# Altium footprint library Metric_Thru_Hole.PcbLib: 91 footprints (part 4 of 6)
Each footprint in its own frame and in the unit in brackets; x right, y up, seen from the top. Pads: shape width x height; smd on the part's side, far side on the other; paste and mask are expansions set on the pad; w line width, h text height; cw(c..) or ccw(c..) is an arc to the next point about the centre after c.
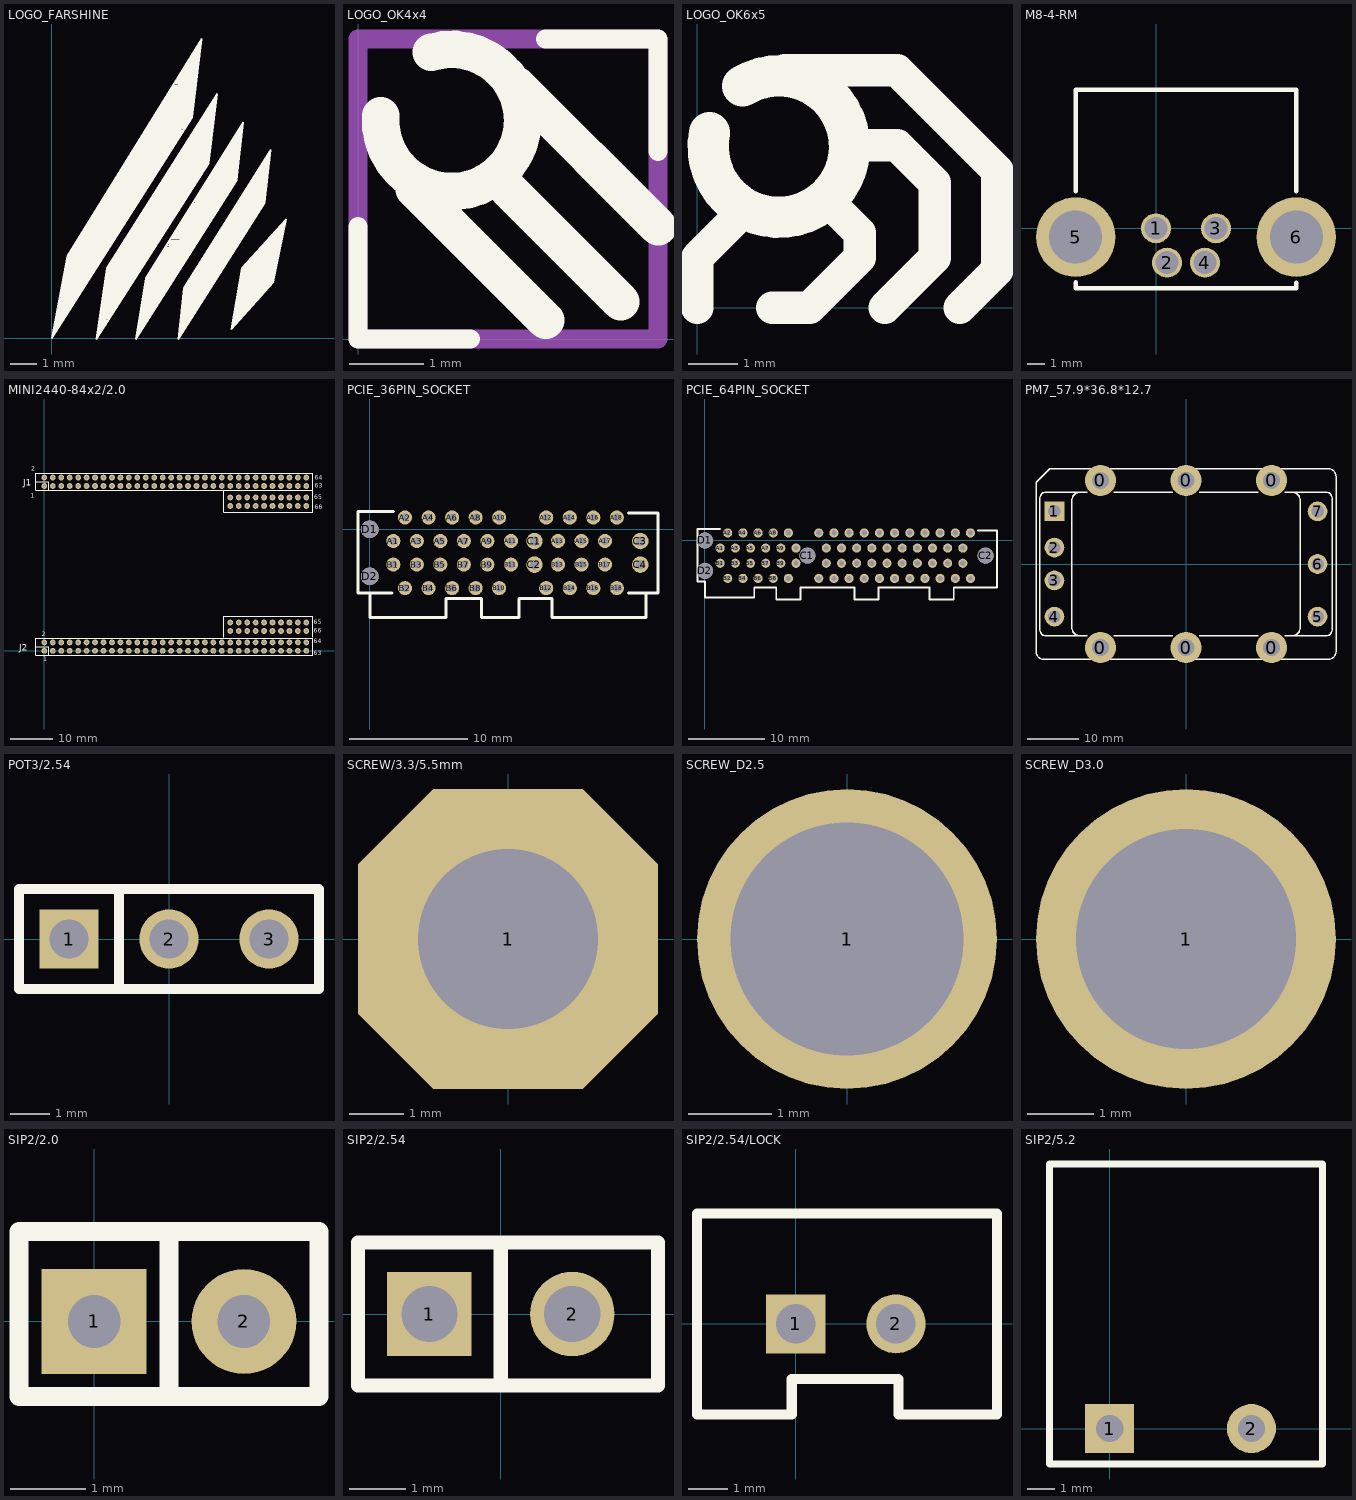
[diagram p3: the footprints below, top view; thin cyan lines are the x and y axes]

## LOGO_FARSHINE [mm] "远光公司标志"
Top Overlay:
  drawing of 1457 lines, arcs and shapes, not listed

## LOGO_OK4x4 [mm] "Okay公司标志 4mm x 4mm"
Top Overlay:
  lines w0.254: 0,1.524 0,0 1.524,0 ; 2.54,4.064 4.064,4.064 4.064,2.54
  lines w0.508: 0.308,3.027 ccw(c1.268,2.96) 0.994,3.883 ; 0.762,2.032 2.54,0.254 ; 2.032,2.032 3.556,0.508 ; 2.159,3.429 4.064,1.524
Mechanical 13:
  lines w0.254: 0,0 0,4.064 4.064,4.064 4.064,0 0,0

## LOGO_OK6x5 [mm] "Okay公司标志 6mm x 5mm"
Top Overlay:
  lines w0.254: 2.286,2.032 2.794,2.032
  lines w0.66: 0,0 0,1.016 1.016,2.032 ; 1.524,0 2.286,0 3.302,1.016 3.302,1.524 2.794,2.032 ; 1.778,4.826 4.064,4.826 6.096,2.794 6.096,0.762 5.334,0 ; 3.048,3.302 4.064,3.302 4.826,2.54 4.826,1.016 3.81,0
  lines w0.838: 0.254,3.556 ccw(c1.663,3.274) 0.924,4.506

## M8-4-RM [mm] "M8针式插头连接器，4芯，公头，弯脚"
pads (6):
  round 1.7 hole 1.3: 1(0,0) 2(0.625,-1.95) 3(3.4,0) 4(2.775,-1.95)
  round 4.5 hole 3: 5(-4.55,-0.5) 6(7.95,-0.5)
Top Overlay:
  lines w0.254: -4.55,-3.05 -4.55,-3.4 7.95,-3.4 7.95,-3.1 ; -4.55,2.1 -4.55,7.85 7.95,7.85 7.95,2.1
3D body "M8-1456048.stp": height 13.4, standoff -2.65, extent -4.647,-2.515 8.153,19.635

## MINI2440-84x2/2.0 [mil] "mini2440座pitch=2.0mm"
height 157.48
pads (168):
  round 54 hole 28: J1-1(0,1535.43) J1-2(0,1614.17) J1-3(78.74,1535.43) J1-4(78.74,1614.17) J1-5(157.48,1535.43) J1-6(157.48,1614.17) J1-7(236.22,1535.43) J1-8(236.22,1614.17) J1-9(314.96,1535.43) J1-10(314.96,1614.17) J1-11(393.7,1535.43) J1-12(393.7,1614.17) J1-13(472.44,1535.43) J1-14(472.44,1614.17) J1-15(551.18,1535.43) J1-16(551.18,1614.17) J1-17(629.92,1535.43) J1-18(629.92,1614.17) J1-19(708.66,1535.43) J1-20(708.66,1614.17) J1-21(787.4,1535.43) J1-22(787.4,1614.17) J1-23(866.14,1535.43) J1-24(866.14,1614.17) J1-25(944.88,1535.43) J1-26(944.88,1614.17) J1-27(1023.62,1535.43) J1-28(1023.62,1614.17) J1-29(1102.36,1535.43) J1-30(1102.36,1614.17) J1-31(1181.1,1535.43) J1-32(1181.1,1614.17) J1-33(1259.84,1535.43) J1-34(1259.84,1614.17) J1-35(1338.58,1535.43) J1-36(1338.58,1614.17) J1-37(1417.32,1535.43) J1-38(1417.32,1614.17) J1-39(1496.06,1535.43) J1-40(1496.06,1614.17) J1-41(1574.8,1535.43) J1-42(1574.8,1614.17) J1-43(1653.54,1535.43) J1-44(1653.54,1614.17) J1-45(1732.28,1535.43) J1-46(1732.28,1614.17) J1-47(1811.02,1535.43) J1-48(1811.02,1614.17) J1-49(1889.76,1535.43) J1-50(1889.76,1614.17) J1-51(1968.5,1535.43) J1-52(1968.5,1614.17) J1-53(2047.24,1535.43) J1-54(2047.24,1614.17) J1-55(2125.98,1535.43) J1-56(2125.98,1614.17) J1-57(2204.72,1535.43) J1-58(2204.72,1614.17) J1-59(2283.46,1535.43) J1-60(2283.46,1614.17) J1-61(2362.2,1535.43) J1-62(2362.2,1614.17) J1-63(2440.94,1535.43) J1-64(2440.94,1614.17) J1-65(2440.94,1429.13) J1-66(2440.94,1350.39) J1-67(2362.2,1429.13) J1-68(2362.2,1350.39) J1-69(2283.46,1429.13) J1-70(2283.46,1350.39) J1-71(2204.72,1429.13) J1-72(2204.72,1350.39) J1-73(2125.98,1429.13) J1-74(2125.98,1350.39) J1-75(2047.24,1429.13) J1-76(2047.24,1350.39) J1-77(1968.5,1429.13) J1-78(1968.5,1350.39) J1-79(1889.76,1429.13) J1-80(1889.76,1350.39) J1-81(1811.02,1429.13) J1-82(1811.02,1350.39) J1-83(1732.28,1429.13) J1-84(1732.28,1350.39) J2-1(0,0) J2-2(0,78.74) J2-3(78.74,0) J2-4(78.74,78.74) J2-5(157.48,0) J2-6(157.48,78.74) J2-7(236.22,0) J2-8(236.22,78.74) J2-9(314.96,0) J2-10(314.96,78.74) J2-11(393.7,0) J2-12(393.7,78.74) J2-13(472.44,0) J2-14(472.44,78.74) J2-15(551.18,0) J2-16(551.18,78.74) J2-17(629.92,0) J2-18(629.92,78.74) J2-19(708.66,0) J2-20(708.66,78.74) J2-21(787.4,0) J2-22(787.4,78.74) J2-23(866.14,0) J2-24(866.14,78.74) J2-25(944.88,0) J2-26(944.88,78.74) J2-27(1023.62,0) J2-28(1023.62,78.74) J2-29(1102.36,0) J2-30(1102.36,78.74) J2-31(1181.1,0) J2-32(1181.1,78.74) J2-33(1259.84,0) J2-34(1259.84,78.74) J2-35(1338.58,0) J2-36(1338.58,78.74) J2-37(1417.32,0) J2-38(1417.32,78.74) J2-39(1496.06,0) J2-40(1496.06,78.74) J2-41(1574.8,0) J2-42(1574.8,78.74) J2-43(1653.54,0) J2-44(1653.54,78.74) J2-45(1732.28,0) J2-46(1732.28,78.74) J2-47(1811.02,0) J2-48(1811.02,78.74) J2-49(1889.76,0) J2-50(1889.76,78.74) J2-51(1968.5,0) J2-52(1968.5,78.74) J2-53(2047.24,0) J2-54(2047.24,78.74) J2-55(2125.98,0) J2-56(2125.98,78.74) J2-57(2204.72,0) J2-58(2204.72,78.74) J2-59(2283.46,0) J2-60(2283.46,78.74) J2-61(2362.2,0) J2-62(2362.2,78.74) J2-63(2440.94,0) J2-64(2440.94,78.74) J2-65(2440.94,263.78) J2-66(2440.94,185.04) J2-67(2362.2,263.78) J2-68(2362.2,185.04) J2-69(2283.46,263.78) J2-70(2283.46,185.04) J2-71(2204.72,263.78) J2-72(2204.72,185.04) J2-73(2125.98,263.78) J2-74(2125.98,185.04) J2-75(2047.24,263.78) J2-76(2047.24,185.04) J2-77(1968.5,263.78) J2-78(1968.5,185.04) J2-79(1889.76,263.78) J2-80(1889.76,185.04) J2-81(1811.02,263.78) J2-82(1811.02,185.04) J2-83(1732.28,263.78) J2-84(1732.28,185.04)
Top Overlay:
  lines w7.87: -78.74,39.37 39.37,39.37 39.37,-39.37 ; -78.74,1574.8 39.37,1574.8 39.37,1496.06 ; 1673.23,125.98 1673.23,322.83 2500,322.83 2500,125.98 ; 1673.23,1496.06 1673.23,1291.34 2500,1291.34 2500,1500 ; -78.74,-39.37 -78.74,118.11 2500,118.11 2500,-39.37 748.03,-39.37 -78.74,-39.37 ; -78.74,1496.06 748.03,1496.06 2500,1496.06 2500,1653.54 -78.74,1653.54 -78.74,1496.06
  text "J2" at -236.22,0 h60
  text "J1" at -196.85,1539.37 h60
  text "66" at 2511.81,169.29 h39.37
  text "65" at 2511.81,248.03 h39.37
  text "63" at 2511.81,-39.37 h39.37
  text "64" at 2511.81,70.87 h39.37
  text "2" at -23.62,133.86 h39.37
  text "1" at -11.81,-98.43 h39.37
  text "1" at -125.98,1425.2 h39.37
  text "2" at -122.05,1677.17 h39.37
  text "64" at 2519.68,1594.49 h39.37
  text "63" at 2519.68,1519.69 h39.37
  text "65" at 2515.75,1413.39 h39.37
  text "66" at 2519.68,1318.9 h39.37
3D body: height 220, standoff 20, extent 1722.36,1420.41 1742.28,1440.37
3D body: height 40, standoff 0, extent 1682.28,1380.39 1781.89,1480.2
3D body: height 220, standoff 20, extent 1722.36,1341.67 1742.28,1361.63
3D body: height 40, standoff 0, extent 1682.28,1301.65 1781.89,1401.46
3D body: height 40, standoff 0, extent 1761.02,1301.65 1860.63,1401.46
3D body: height 220, standoff 20, extent 1801.1,1341.67 1821.02,1361.63
3D body: height 40, standoff 0, extent 1761.02,1380.39 1860.63,1480.2
3D body: height 220, standoff 20, extent 1801.1,1420.41 1821.02,1440.37
3D body: height 220, standoff 20, extent 2037.32,1420.41 2057.24,1440.37
3D body: height 40, standoff 0, extent 1997.24,1380.39 2096.85,1480.2
3D body: height 220, standoff 20, extent 2037.32,1341.67 2057.24,1361.63
3D body: height 40, standoff 0, extent 1997.24,1301.65 2096.85,1401.46
3D body: height 40, standoff 0, extent 2075.98,1301.65 2175.59,1401.46
3D body: height 220, standoff 20, extent 2116.06,1341.67 2135.98,1361.63
3D body: height 40, standoff 0, extent 2075.98,1380.39 2175.59,1480.2
3D body: height 220, standoff 20, extent 2116.06,1420.41 2135.98,1440.37
3D body: height 220, standoff 20, extent 1879.84,1420.41 1899.76,1440.37
3D body: height 40, standoff 0, extent 1839.76,1380.39 1939.37,1480.2
3D body: height 220, standoff 20, extent 1879.84,1341.67 1899.76,1361.63
3D body: height 40, standoff 0, extent 1839.76,1301.65 1939.37,1401.46
3D body: height 40, standoff 0, extent 1918.5,1301.65 2018.11,1401.46
3D body: height 220, standoff 20, extent 1958.58,1341.67 1978.5,1361.63
3D body: height 40, standoff 0, extent 1918.5,1380.39 2018.11,1480.2
3D body: height 220, standoff 20, extent 1958.58,1420.41 1978.5,1440.37
3D body: height 220, standoff 20, extent 2352.28,1420.41 2372.2,1440.37
3D body: height 40, standoff 0, extent 2312.2,1380.39 2411.81,1480.2
3D body: height 220, standoff 20, extent 2352.28,1341.67 2372.2,1361.63
3D body: height 40, standoff 0, extent 2312.2,1301.65 2411.81,1401.46
3D body: height 40, standoff 0, extent 2390.94,1301.65 2490.55,1401.46
3D body: height 220, standoff 20, extent 2431.02,1341.67 2450.94,1361.63
3D body: height 40, standoff 0, extent 2390.94,1380.39 2490.55,1480.2
3D body: height 220, standoff 20, extent 2431.02,1420.41 2450.94,1440.37
3D body: height 220, standoff 20, extent 2194.8,1420.41 2214.72,1440.37
3D body: height 40, standoff 0, extent 2154.72,1380.39 2254.33,1480.2
3D body: height 220, standoff 20, extent 2194.8,1341.67 2214.72,1361.63
3D body: height 40, standoff 0, extent 2154.72,1301.65 2254.33,1401.46
3D body: height 40, standoff 0, extent 2233.46,1301.65 2333.07,1401.46
3D body: height 220, standoff 20, extent 2273.54,1341.67 2293.46,1361.63
3D body: height 40, standoff 0, extent 2233.46,1380.39 2333.07,1480.2
3D body: height 220, standoff 20, extent 2273.54,1420.41 2293.46,1440.37
3D body: height 220, standoff 20, extent 2352.28,1605.45 2372.2,1625.41
3D body: height 40, standoff 0, extent 2312.2,1565.43 2411.81,1665.24
3D body: height 220, standoff 20, extent 2352.28,1526.71 2372.2,1546.67
3D body: height 40, standoff 0, extent 2312.2,1486.69 2411.81,1586.5
3D body: height 40, standoff 0, extent 2390.94,1486.69 2490.55,1586.5
3D body: height 220, standoff 20, extent 2431.02,1526.71 2450.94,1546.67
3D body: height 40, standoff 0, extent 2390.94,1565.43 2490.55,1665.24
3D body: height 220, standoff 20, extent 2431.02,1605.45 2450.94,1625.41
3D body: height 220, standoff 20, extent 2194.8,1605.45 2214.72,1625.41
3D body: height 40, standoff 0, extent 2154.72,1565.43 2254.33,1665.24
3D body: height 220, standoff 20, extent 2194.8,1526.71 2214.72,1546.67
3D body: height 40, standoff 0, extent 2154.72,1486.69 2254.33,1586.5
3D body: height 40, standoff 0, extent 2233.46,1486.69 2333.07,1586.5
3D body: height 220, standoff 20, extent 2273.54,1526.71 2293.46,1546.67
3D body: height 40, standoff 0, extent 2233.46,1565.43 2333.07,1665.24
3D body: height 220, standoff 20, extent 2273.54,1605.45 2293.46,1625.41
3D body: height 220, standoff 20, extent 2037.32,1605.45 2057.24,1625.41
3D body: height 40, standoff 0, extent 1997.24,1565.43 2096.85,1665.24
3D body: height 220, standoff 20, extent 2037.32,1526.71 2057.24,1546.67
3D body: height 40, standoff 0, extent 1997.24,1486.69 2096.85,1586.5
3D body: height 40, standoff 0, extent 2075.98,1486.69 2175.59,1586.5
3D body: height 220, standoff 20, extent 2116.06,1526.71 2135.98,1546.67
3D body: height 40, standoff 0, extent 2075.98,1565.43 2175.59,1665.24
3D body: height 220, standoff 20, extent 2116.06,1605.45 2135.98,1625.41
3D body: height 220, standoff 20, extent 1879.84,1605.45 1899.76,1625.41
3D body: height 40, standoff 0, extent 1839.76,1565.43 1939.37,1665.24
3D body: height 220, standoff 20, extent 1879.84,1526.71 1899.76,1546.67
3D body: height 40, standoff 0, extent 1839.76,1486.69 1939.37,1586.5
3D body: height 40, standoff 0, extent 1918.5,1486.69 2018.11,1586.5
3D body: height 220, standoff 20, extent 1958.58,1526.71 1978.5,1546.67
3D body: height 40, standoff 0, extent 1918.5,1565.43 2018.11,1665.24
3D body: height 220, standoff 20, extent 1958.58,1605.45 1978.5,1625.41
3D body: height 220, standoff 20, extent 1722.36,1605.45 1742.28,1625.41
3D body: height 40, standoff 0, extent 1682.28,1565.43 1781.89,1665.24
3D body: height 220, standoff 20, extent 1722.36,1526.71 1742.28,1546.67
3D body: height 40, standoff 0, extent 1682.28,1486.69 1781.89,1586.5
3D body: height 40, standoff 0, extent 1761.02,1486.69 1860.63,1586.5
3D body: height 220, standoff 20, extent 1801.1,1526.71 1821.02,1546.67
3D body: height 40, standoff 0, extent 1761.02,1565.43 1860.63,1665.24
3D body: height 220, standoff 20, extent 1801.1,1605.45 1821.02,1625.41
3D body: height 220, standoff 20, extent 1564.88,1605.45 1584.8,1625.41
3D body: height 40, standoff 0, extent 1524.8,1565.43 1624.41,1665.24
3D body: height 220, standoff 20, extent 1564.88,1526.71 1584.8,1546.67
3D body: height 40, standoff 0, extent 1524.8,1486.69 1624.41,1586.5
3D body: height 40, standoff 0, extent 1603.54,1486.69 1703.15,1586.5
3D body: height 220, standoff 20, extent 1643.62,1526.71 1663.54,1546.67
3D body: height 40, standoff 0, extent 1603.54,1565.43 1703.15,1665.24
3D body: height 220, standoff 20, extent 1643.62,1605.45 1663.54,1625.41
3D body: height 220, standoff 20, extent 1407.4,1605.45 1427.32,1625.41
3D body: height 40, standoff 0, extent 1367.32,1565.43 1466.93,1665.24
3D body: height 220, standoff 20, extent 1407.4,1526.71 1427.32,1546.67
3D body: height 40, standoff 0, extent 1367.32,1486.69 1466.93,1586.5
3D body: height 40, standoff 0, extent 1446.06,1486.69 1545.67,1586.5
3D body: height 220, standoff 20, extent 1486.14,1526.71 1506.06,1546.67
3D body: height 40, standoff 0, extent 1446.06,1565.43 1545.67,1665.24
3D body: height 220, standoff 20, extent 1486.14,1605.45 1506.06,1625.41
3D body: height 220, standoff 20, extent 1249.92,1605.45 1269.84,1625.41
3D body: height 40, standoff 0, extent 1209.84,1565.43 1309.45,1665.24
3D body: height 220, standoff 20, extent 1249.92,1526.71 1269.84,1546.67
3D body: height 40, standoff 0, extent 1209.84,1486.69 1309.45,1586.5
3D body: height 40, standoff 0, extent 1288.58,1486.69 1388.19,1586.5
3D body: height 220, standoff 20, extent 1328.66,1526.71 1348.58,1546.67
3D body: height 40, standoff 0, extent 1288.58,1565.43 1388.19,1665.24
3D body: height 220, standoff 20, extent 1328.66,1605.45 1348.58,1625.41
3D body: height 220, standoff 20, extent 1092.44,1605.45 1112.36,1625.41
3D body: height 40, standoff 0, extent 1052.36,1565.43 1151.97,1665.24
3D body: height 220, standoff 20, extent 1092.44,1526.71 1112.36,1546.67
3D body: height 40, standoff 0, extent 1052.36,1486.69 1151.97,1586.5
3D body: height 40, standoff 0, extent 1131.1,1486.69 1230.71,1586.5
3D body: height 220, standoff 20, extent 1171.18,1526.71 1191.1,1546.67
3D body: height 40, standoff 0, extent 1131.1,1565.43 1230.71,1665.24
3D body: height 220, standoff 20, extent 1171.18,1605.45 1191.1,1625.41
3D body: height 220, standoff 20, extent 934.96,1605.45 954.88,1625.41
3D body: height 40, standoff 0, extent 894.88,1565.43 994.49,1665.24
3D body: height 220, standoff 20, extent 934.96,1526.71 954.88,1546.67
3D body: height 40, standoff 0, extent 894.88,1486.69 994.49,1586.5
3D body: height 40, standoff 0, extent 973.62,1486.69 1073.23,1586.5
3D body: height 220, standoff 20, extent 1013.7,1526.71 1033.62,1546.67
3D body: height 40, standoff 0, extent 973.62,1565.43 1073.23,1665.24
3D body: height 220, standoff 20, extent 1013.7,1605.45 1033.62,1625.41
3D body: height 220, standoff 20, extent 777.48,1605.45 797.4,1625.41
3D body: height 40, standoff 0, extent 737.4,1565.43 837.01,1665.24
3D body: height 220, standoff 20, extent 777.48,1526.71 797.4,1546.67
3D body: height 40, standoff 0, extent 737.4,1486.69 837.01,1586.5
3D body: height 40, standoff 0, extent 816.14,1486.69 915.75,1586.5
3D body: height 220, standoff 20, extent 856.22,1526.71 876.14,1546.67
3D body: height 40, standoff 0, extent 816.14,1565.43 915.75,1665.24
3D body: height 220, standoff 20, extent 856.22,1605.45 876.14,1625.41
3D body: height 220, standoff 20, extent 620,1605.45 639.92,1625.41
3D body: height 40, standoff 0, extent 579.92,1565.43 679.53,1665.24
3D body: height 220, standoff 20, extent 620,1526.71 639.92,1546.67
3D body: height 40, standoff 0, extent 579.92,1486.69 679.53,1586.5
3D body: height 40, standoff 0, extent 658.66,1486.69 758.27,1586.5
3D body: height 220, standoff 20, extent 698.74,1526.71 718.66,1546.67
3D body: height 40, standoff 0, extent 658.66,1565.43 758.27,1665.24
3D body: height 220, standoff 20, extent 698.74,1605.45 718.66,1625.41
3D body: height 220, standoff 20, extent 462.52,1605.45 482.44,1625.41
3D body: height 40, standoff 0, extent 422.44,1565.43 522.05,1665.24
3D body: height 220, standoff 20, extent 462.52,1526.71 482.44,1546.67
3D body: height 40, standoff 0, extent 422.44,1486.69 522.05,1586.5
3D body: height 40, standoff 0, extent 501.18,1486.69 600.79,1586.5
3D body: height 220, standoff 20, extent 541.26,1526.71 561.18,1546.67
3D body: height 40, standoff 0, extent 501.18,1565.43 600.79,1665.24
3D body: height 220, standoff 20, extent 541.26,1605.45 561.18,1625.41
3D body: height 220, standoff 20, extent 305.04,1605.45 324.96,1625.41
3D body: height 40, standoff 0, extent 264.96,1565.43 364.57,1665.24
3D body: height 220, standoff 20, extent 305.04,1526.71 324.96,1546.67
3D body: height 40, standoff 0, extent 264.96,1486.69 364.57,1586.5
3D body: height 40, standoff 0, extent 343.7,1486.69 443.31,1586.5
3D body: height 220, standoff 20, extent 383.78,1526.71 403.7,1546.67
3D body: height 40, standoff 0, extent 343.7,1565.43 443.31,1665.24
3D body: height 220, standoff 20, extent 383.78,1605.45 403.7,1625.41
3D body: height 220, standoff 20, extent 147.56,1605.45 167.48,1625.41
3D body: height 40, standoff 0, extent 107.48,1565.43 207.09,1665.24
3D body: height 220, standoff 20, extent 147.56,1526.71 167.48,1546.67
3D body: height 40, standoff 0, extent 107.48,1486.69 207.09,1586.5
3D body: height 40, standoff 0, extent 186.22,1486.69 285.83,1586.5
3D body: height 220, standoff 20, extent 226.3,1526.71 246.22,1546.67
3D body: height 40, standoff 0, extent 186.22,1565.43 285.83,1665.24
3D body: height 220, standoff 20, extent 226.3,1605.45 246.22,1625.41
3D body: height 220, standoff 20, extent -9.92,70.02 10,89.98
3D body: height 40, standoff 0, extent -50,30 49.61,129.8
3D body: height 220, standoff 20, extent -9.92,-8.72 10,11.24
3D body: height 40, standoff 0, extent -50,-48.74 49.61,51.06
3D body: height 40, standoff 0, extent 28.74,-48.74 128.35,51.06
3D body: height 220, standoff 20, extent 68.82,-8.72 88.74,11.24
3D body: height 40, standoff 0, extent 28.74,30 128.35,129.8
3D body: height 220, standoff 20, extent 68.82,70.02 88.74,89.98
3D body: height 40, standoff 0, extent 107.48,-48.74 207.09,51.06
3D body: height 220, standoff 20, extent 147.56,-8.72 167.48,11.24
3D body: height 40, standoff 0, extent 107.48,30 207.09,129.8
3D body: height 220, standoff 20, extent 147.56,70.02 167.48,89.98
3D body: height 40, standoff 0, extent 186.22,-48.74 285.83,51.06
3D body: height 220, standoff 20, extent 226.3,-8.72 246.22,11.24
3D body: height 40, standoff 0, extent 186.22,30 285.83,129.8
3D body: height 220, standoff 20, extent 226.3,70.02 246.22,89.98
3D body: height 220, standoff 20, extent 383.78,70.02 403.7,89.98
3D body: height 40, standoff 0, extent 343.7,30 443.31,129.8
3D body: height 220, standoff 20, extent 383.78,-8.72 403.7,11.24
3D body: height 40, standoff 0, extent 343.7,-48.74 443.31,51.06
3D body: height 40, standoff 0, extent 264.96,-48.74 364.57,51.06
3D body: height 220, standoff 20, extent 305.04,-8.72 324.96,11.24
3D body: height 40, standoff 0, extent 264.96,30 364.57,129.8
3D body: height 220, standoff 20, extent 305.04,70.02 324.96,89.98
3D body: height 220, standoff 20, extent 541.26,70.02 561.18,89.98
3D body: height 40, standoff 0, extent 501.18,30 600.79,129.8
3D body: height 220, standoff 20, extent 541.26,-8.72 561.18,11.24
3D body: height 40, standoff 0, extent 501.18,-48.74 600.79,51.06
3D body: height 40, standoff 0, extent 422.44,-48.74 522.05,51.06
3D body: height 220, standoff 20, extent 462.52,-8.72 482.44,11.24
3D body: height 40, standoff 0, extent 422.44,30 522.05,129.8
3D body: height 220, standoff 20, extent 462.52,70.02 482.44,89.98
3D body: height 220, standoff 20, extent 698.74,70.02 718.66,89.98
3D body: height 40, standoff 0, extent 658.66,30 758.27,129.8
3D body: height 220, standoff 20, extent 698.74,-8.72 718.66,11.24
3D body: height 40, standoff 0, extent 658.66,-48.74 758.27,51.06
3D body: height 40, standoff 0, extent 579.92,-48.74 679.53,51.06
3D body: height 220, standoff 20, extent 620,-8.72 639.92,11.24
3D body: height 40, standoff 0, extent 579.92,30 679.53,129.8
3D body: height 220, standoff 20, extent 620,70.02 639.92,89.98
3D body: height 220, standoff 20, extent 856.22,70.02 876.14,89.98
3D body: height 40, standoff 0, extent 816.14,30 915.75,129.8
3D body: height 220, standoff 20, extent 856.22,-8.72 876.14,11.24
3D body: height 40, standoff 0, extent 816.14,-48.74 915.75,51.06
3D body: height 40, standoff 0, extent 737.4,-48.74 837.01,51.06
3D body: height 220, standoff 20, extent 777.48,-8.72 797.4,11.24
3D body: height 40, standoff 0, extent 737.4,30 837.01,129.8
3D body: height 220, standoff 20, extent 777.48,70.02 797.4,89.98
3D body: height 220, standoff 20, extent 1013.7,70.02 1033.62,89.98
3D body: height 40, standoff 0, extent 973.62,30 1073.23,129.8
3D body: height 220, standoff 20, extent 1013.7,-8.72 1033.62,11.24
3D body: height 40, standoff 0, extent 973.62,-48.74 1073.23,51.06
3D body: height 40, standoff 0, extent 894.88,-48.74 994.49,51.06
3D body: height 220, standoff 20, extent 934.96,-8.72 954.88,11.24
3D body: height 40, standoff 0, extent 894.88,30 994.49,129.8
3D body: height 220, standoff 20, extent 934.96,70.02 954.88,89.98
3D body: height 220, standoff 20, extent 1171.18,70.02 1191.1,89.98
3D body: height 40, standoff 0, extent 1131.1,30 1230.71,129.8
3D body: height 220, standoff 20, extent 1171.18,-8.72 1191.1,11.24
3D body: height 40, standoff 0, extent 1131.1,-48.74 1230.71,51.06
3D body: height 40, standoff 0, extent 1052.36,-48.74 1151.97,51.06
3D body: height 220, standoff 20, extent 1092.44,-8.72 1112.36,11.24
3D body: height 40, standoff 0, extent 1052.36,30 1151.97,129.8
3D body: height 220, standoff 20, extent 1092.44,70.02 1112.36,89.98
3D body: height 220, standoff 20, extent 1328.66,70.02 1348.58,89.98
3D body: height 40, standoff 0, extent 1288.58,30 1388.19,129.8
3D body: height 220, standoff 20, extent 1328.66,-8.72 1348.58,11.24
3D body: height 40, standoff 0, extent 1288.58,-48.74 1388.19,51.06
3D body: height 40, standoff 0, extent 1209.84,-48.74 1309.45,51.06
3D body: height 220, standoff 20, extent 1249.92,-8.72 1269.84,11.24
3D body: height 40, standoff 0, extent 1209.84,30 1309.45,129.8
3D body: height 220, standoff 20, extent 1249.92,70.02 1269.84,89.98
3D body: height 220, standoff 20, extent 1486.14,70.02 1506.06,89.98
3D body: height 40, standoff 0, extent 1446.06,30 1545.67,129.8
3D body: height 220, standoff 20, extent 1486.14,-8.72 1506.06,11.24
3D body: height 40, standoff 0, extent 1446.06,-48.74 1545.67,51.06
3D body: height 40, standoff 0, extent 1367.32,-48.74 1466.93,51.06
3D body: height 220, standoff 20, extent 1407.4,-8.72 1427.32,11.24
3D body: height 40, standoff 0, extent 1367.32,30 1466.93,129.8
3D body: height 220, standoff 20, extent 1407.4,70.02 1427.32,89.98
3D body: height 220, standoff 20, extent 1643.62,70.02 1663.54,89.98
3D body: height 40, standoff 0, extent 1603.54,30 1703.15,129.8
3D body: height 220, standoff 20, extent 1643.62,-8.72 1663.54,11.24
3D body: height 40, standoff 0, extent 1603.54,-48.74 1703.15,51.06
3D body: height 40, standoff 0, extent 1524.8,-48.74 1624.41,51.06
3D body: height 220, standoff 20, extent 1564.88,-8.72 1584.8,11.24
3D body: height 40, standoff 0, extent 1524.8,30 1624.41,129.8
3D body: height 220, standoff 20, extent 1564.88,70.02 1584.8,89.98
3D body: height 220, standoff 20, extent 1801.1,70.02 1821.02,89.98
3D body: height 40, standoff 0, extent 1761.02,30 1860.63,129.8
3D body: height 220, standoff 20, extent 1801.1,-8.72 1821.02,11.24
3D body: height 40, standoff 0, extent 1761.02,-48.74 1860.63,51.06
3D body: height 40, standoff 0, extent 1682.28,-48.74 1781.89,51.06
3D body: height 220, standoff 20, extent 1722.36,-8.72 1742.28,11.24
3D body: height 40, standoff 0, extent 1682.28,30 1781.89,129.8
3D body: height 220, standoff 20, extent 1722.36,70.02 1742.28,89.98
3D body: height 220, standoff 20, extent 1958.58,70.02 1978.5,89.98
3D body: height 40, standoff 0, extent 1918.5,30 2018.11,129.8
3D body: height 220, standoff 20, extent 1958.58,-8.72 1978.5,11.24
3D body: height 40, standoff 0, extent 1918.5,-48.74 2018.11,51.06
3D body: height 40, standoff 0, extent 1839.76,-48.74 1939.37,51.06
3D body: height 220, standoff 20, extent 1879.84,-8.72 1899.76,11.24
3D body: height 40, standoff 0, extent 1839.76,30 1939.37,129.8
3D body: height 220, standoff 20, extent 1879.84,70.02 1899.76,89.98
3D body: height 220, standoff 20, extent 2116.06,70.02 2135.98,89.98
3D body: height 40, standoff 0, extent 2075.98,30 2175.59,129.8
3D body: height 220, standoff 20, extent 2116.06,-8.72 2135.98,11.24
3D body: height 40, standoff 0, extent 2075.98,-48.74 2175.59,51.06
3D body: height 40, standoff 0, extent 1997.24,-48.74 2096.85,51.06
3D body: height 220, standoff 20, extent 2037.32,-8.72 2057.24,11.24
3D body: height 40, standoff 0, extent 1997.24,30 2096.85,129.8
3D body: height 220, standoff 20, extent 2037.32,70.02 2057.24,89.98
3D body: height 220, standoff 20, extent 2273.54,70.02 2293.46,89.98
3D body: height 40, standoff 0, extent 2233.46,30 2333.07,129.8
3D body: height 220, standoff 20, extent 2273.54,-8.72 2293.46,11.24
3D body: height 40, standoff 0, extent 2233.46,-48.74 2333.07,51.06
3D body: height 40, standoff 0, extent 2154.72,-48.74 2254.33,51.06
3D body: height 220, standoff 20, extent 2194.8,-8.72 2214.72,11.24
3D body: height 40, standoff 0, extent 2154.72,30 2254.33,129.8
3D body: height 220, standoff 20, extent 2194.8,70.02 2214.72,89.98
3D body: height 220, standoff 20, extent 2431.02,70.02 2450.94,89.98
3D body: height 40, standoff 0, extent 2390.94,30 2490.55,129.8
3D body: height 220, standoff 20, extent 2431.02,-8.72 2450.94,11.24
3D body: height 40, standoff 0, extent 2390.94,-48.74 2490.55,51.06
3D body: height 40, standoff 0, extent 2312.2,-48.74 2411.81,51.06
3D body: height 220, standoff 20, extent 2352.28,-8.72 2372.2,11.24
3D body: height 40, standoff 0, extent 2312.2,30 2411.81,129.8
3D body: height 220, standoff 20, extent 2352.28,70.02 2372.2,89.98
3D body: height 220, standoff 20, extent 1801.1,255.06 1821.02,275.02
3D body: height 40, standoff 0, extent 1761.02,215.04 1860.63,314.84
3D body: height 220, standoff 20, extent 1801.1,176.32 1821.02,196.28
3D body: height 40, standoff 0, extent 1761.02,136.3 1860.63,236.1
3D body: height 40, standoff 0, extent 1682.28,136.3 1781.89,236.1
3D body: height 220, standoff 20, extent 1722.36,176.32 1742.28,196.28
3D body: height 40, standoff 0, extent 1682.28,215.04 1781.89,314.84
3D body: height 220, standoff 20, extent 1722.36,255.06 1742.28,275.02
3D body: height 220, standoff 20, extent 1958.58,255.06 1978.5,275.02
3D body: height 40, standoff 0, extent 1918.5,215.04 2018.11,314.84
3D body: height 220, standoff 20, extent 1958.58,176.32 1978.5,196.28
3D body: height 40, standoff 0, extent 1918.5,136.3 2018.11,236.1
3D body: height 40, standoff 0, extent 1839.76,136.3 1939.37,236.1
3D body: height 220, standoff 20, extent 1879.84,176.32 1899.76,196.28
3D body: height 40, standoff 0, extent 1839.76,215.04 1939.37,314.84
3D body: height 220, standoff 20, extent 1879.84,255.06 1899.76,275.02
3D body: height 220, standoff 20, extent 2116.06,255.06 2135.98,275.02
3D body: height 40, standoff 0, extent 2075.98,215.04 2175.59,314.84
3D body: height 220, standoff 20, extent 2116.06,176.32 2135.98,196.28
3D body: height 40, standoff 0, extent 2075.98,136.3 2175.59,236.1
3D body: height 40, standoff 0, extent 1997.24,136.3 2096.85,236.1
3D body: height 220, standoff 20, extent 2037.32,176.32 2057.24,196.28
3D body: height 40, standoff 0, extent 1997.24,215.04 2096.85,314.84
3D body: height 220, standoff 20, extent 2037.32,255.06 2057.24,275.02
3D body: height 220, standoff 20, extent 2273.54,255.06 2293.46,275.02
3D body: height 40, standoff 0, extent 2233.46,215.04 2333.07,314.84
3D body: height 220, standoff 20, extent 2273.54,176.32 2293.46,196.28
3D body: height 40, standoff 0, extent 2233.46,136.3 2333.07,236.1
3D body: height 40, standoff 0, extent 2154.72,136.3 2254.33,236.1
3D body: height 220, standoff 20, extent 2194.8,176.32 2214.72,196.28
3D body: height 40, standoff 0, extent 2154.72,215.04 2254.33,314.84
3D body: height 220, standoff 20, extent 2194.8,255.06 2214.72,275.02
3D body: height 220, standoff 20, extent 2431.02,255.06 2450.94,275.02
3D body: height 40, standoff 0, extent 2390.94,215.04 2490.55,314.84
3D body: height 220, standoff 20, extent 2431.02,176.32 2450.94,196.28
3D body: height 40, standoff 0, extent 2390.94,136.3 2490.55,236.1
3D body: height 40, standoff 0, extent 2312.2,136.3 2411.81,236.1
3D body: height 220, standoff 20, extent 2352.28,176.32 2372.2,196.28
3D body: height 40, standoff 0, extent 2312.2,215.04 2411.81,314.84
3D body: height 220, standoff 20, extent 2352.28,255.06 2372.2,275.02
3D body: height 220, standoff 20, extent 68.82,1605.45 88.74,1625.41
3D body: height 40, standoff 0, extent 28.74,1565.43 128.35,1665.24
3D body: height 220, standoff 20, extent 68.82,1526.71 88.74,1546.67
3D body: height 40, standoff 0, extent 28.74,1486.69 128.35,1586.5
3D body: height 40, standoff 0, extent -50,1486.69 49.61,1586.5
3D body: height 220, standoff 20, extent -9.92,1526.71 10,1546.67
3D body: height 40, standoff 0, extent -50,1565.43 49.61,1665.24
3D body: height 220, standoff 20, extent -9.92,1605.45 10,1625.41

## PCIE_36PIN_SOCKET [mm] "PCIex1座"
height 10
pads (42):
  round 1.2 hole 0.7: A1(2,-1) A2(3,1) A3(4,-1) A4(5,1) A5(6,-1) A6(7,1) A7(8,-1) A8(9,1) A9(10,-1) A10(11,1) A11(12,-1) A12(15,1) A13(16,-1) A14(17,1) A15(18,-1) A16(19,1) A17(20,-1) A18(21,1) B1(2,-3) B2(3,-5) B3(4,-3) B4(5,-5) B5(6,-3) B6(7,-5) B7(8,-3) B8(9,-5) B9(10,-3) B10(11,-5) B11(12,-3) B12(15,-5) B13(16,-3) B14(17,-5) B15(18,-3) B16(19,-5) B17(20,-3) B18(21,-5)
  round 1.4 hole 0.8: C1(14,-1) C2(14,-3) C3(23,-1) C4(23,-3)
  round 1.5 hole 1.5: D1(0,0) D2(0,-4)
Top Overlay:
  lines w0.254: 0,-5.4 0,-7.5 6.5,-7.5 6.5,-5.9 9.5,-5.9 9.5,-7.5 12.7,-7.5 12.7,-5.9 15.5,-5.9 15.5,-7.5 23.5,-7.5 23.5,-5.4 ; 1.9,-5.4 -1,-5.4 -1,1.5 2,1.5 ; 22,-5.4 24.5,-5.4 24.5,1.4 22,1.4
3D body: height 10.3, standoff 0.1, extent -0.4,-3.6 23.5,-0.4
3D body: height 10, standoff 9, extent 0,-7.5 23.5,-5.5
3D body: height 10, standoff 0.1, extent -1,-5.4 24.5,1.5

## PCIE_64PIN_SOCKET [mm] "PCIex4座"
height 10
pads (68):
  round 1.2 hole 0.7: A1(2,-1) A2(3,1) A3(4,-1) A4(5,1) A5(6,-1) A6(7,1) A7(8,-1) A8(9,1) A9(10,-1) A10(11,1) A11(12,-1) A12(15,1) A13(16,-1) A14(17,1) A15(18,-1) A16(19,1) A17(20,-1) A18(21,1) A19(22,-1) A20(23,1) A21(24,-1) A22(25,1) A23(26,-1) A24(27,1) A25(28,-1) A26(29,1) A27(30,-1) A28(31,1) A29(32,-1) A30(33,1) A31(34,-1) A32(35,1) B1(2,-3) B2(3,-5) B3(4,-3) B4(5,-5) B5(6,-3) B6(7,-5) B7(8,-3) B8(9,-5) B9(10,-3) B10(11,-5) B11(12,-3) B12(15,-5) B13(16,-3) B14(17,-5) B15(18,-3) B16(19,-5) B17(20,-3) B18(21,-5) B19(22,-3) B20(23,-5) B21(24,-3) B22(25,-5) B23(26,-3) B24(27,-5) B25(28,-3) B26(29,-5) B27(30,-3) B28(31,-5) B29(32,-3) B30(33,-5) B31(34,-3) B32(35,-5)
  round 2.1 hole 2.1: C1(13.5,-2) C2(37,-2) D1(0,0) D2(0,-4)
Top Overlay:
  lines w0.254: 2,1.5 -1,1.5 -1,-5.4 0,-5.4 0,-7.5 6.5,-7.5 6.5,-6.2 9.4,-6.2 9.4,-7.8 12.6,-7.8 12.6,-6.2 19.7,-6.2 19.7,-7.8 22.9,-7.8 22.9,-6.2 29.6,-6.2 29.6,-7.8 32.8,-7.8 32.8,-6.2 38.5,-6.2 38.5,1.3 36,1.3
3D body: height 10.3, standoff 0.1, extent 0.8,-3.6 36.8,-0.4
3D body: height 10, standoff 9, extent 0.8,-7.5 36.5,-5.5
3D body: height 10, standoff 0.1, extent -1,-5.4 38.4,1.5

## PM7_57.9*36.8*12.7 [mm] "57.9X36.8X12.7mm"
height 12.7
pads (13):
  round 6 hole 3.28: 0(-16.51,-16.129) 0(-16.51,16.129) 0(0,-16.129) 0(0,16.129) 0(16.51,-16.129) 0(16.51,16.129)
  rect 3.81x3.81 hole 2.413: 1(-25.4,10.16)
  round 3.81 hole 2.413: 2(-25.4,3.175) 3(-25.4,-3.175) 4(-25.4,-10.16) 5(25.4,-10.16) 6(25.4,0) 7(25.4,10.16)
Top Overlay:
  lines w0.254: -27.178,-13.843 -19.05,-13.843 ; -27.119,-13.843 cw(c-27.119,-12.768) -28.194,-12.768 -28.194,12.768 cw(c-27.119,12.768) -27.119,13.843 -19.05,13.843 ; -20.498,-13.843 cw(c-20.498,-12.319) -22.022,-12.319 -22.022,12.319 cw(c-20.498,12.319) -20.498,13.843 ; -13.97,-13.843 -2.54,-13.843 ; -13.97,13.843 -2.54,13.843 ; 2.54,-13.843 13.97,-13.843 ; 2.54,13.843 13.97,13.843 ; 19.05,-13.843 27.305,-13.843 ; 19.05,13.843 27.119,13.843 cw(c27.119,12.768) 28.194,12.768 28.194,-12.768 cw(c27.119,-12.768) 27.119,-13.843 ; 20.498,-13.843 ccw(c20.498,-12.319) 22.022,-12.319 22.022,12.319 ccw(c20.498,12.319) 20.498,13.843 ; -28.956,-16.891 ccw(c-27.432,-16.891) -27.432,-18.415 27.432,-18.415 ccw(c27.432,-16.891) 28.956,-16.891 28.956,16.891 ccw(c27.432,16.891) 27.432,18.415 -26.289,18.415 -28.956,15.748 -28.956,-16.891
Bottom Overlay:
  text "SC" at 22.606,-0.508 h1.02
  text "+OUT" at 22.733,9.652 h1.02
  text "-OUT" at 22.606,-10.795 h1.02
  text "-IN" at -19.939,-10.922 h1.02
  text "+IN" at -19.939,9.652 h1.02
  text "PR" at -20.828,-3.683 h1.02
  text "PC" at -20.828,2.667 h1.02
3D body: height 11.7, standoff 0.1, extent -28.956,-18.288 28.448,18.288

## POT3/2.54 [mm] "3296W电位器间距100mil"
height 10.16
pads (3):
  rect 1.5x1.5 hole 1: 1(-2.54,0)
  round 1.5 hole 1: 2(0,0) 3(2.54,0)
Top Overlay:
  lines w0.254: -1.27,-1.27 -1.27,1.27 ; -3.81,-1.27 3.81,-1.27 3.81,1.27 -3.81,1.27 -3.81,-1.27
3D body: height 5.11, standoff 0.03, extent 2.288,-0.253 2.794,0.253
3D body: height 5.11, standoff 0.03, extent -0.252,-0.253 0.254,0.253
3D body: height 5.11, standoff 0.03, extent -2.792,-0.253 -2.286,0.253
3D body "SW3dPS-0_1inch pin strip.STEP": height 1.05, standoff -10.55, extent -3.82,-1.27 3.8,1.27

## SCREW/3.3/5.5mm [mm] "固定螺丝孔"
pads (1):
  oct 5.5x5.5 hole 3.3: 1(0,0)

## SCREW_D2.5 [mm] "D2.5mm螺丝孔"
height 2
pads (1):
  round 3.6 hole 2.8: 1(0,0)

## SCREW_D3.0 [mm] "D3.0mm螺钉孔"
height 2.5
pads (1):
  round 4.5 hole 3.3: 1(0,0)

## SIP2/2.0 [mm] "2 Leads,Pitch=2.0mm,焊盘:外径1.4mm.孔径0.7mm"
height 5
pads (2):
  rect 1.4x1.4 hole 0.7: 1(0,0)
  round 1.4 hole 0.7: 2(2,0)
Top Overlay:
  lines w0.254: 1,1.2 1,-1 -1,-1 ; -1,-1 -1,1.2 3,1.2 3,-1 -1,-1
3D body: height 5.59, standoff 0.51, extent -0.252,-0.253 0.254,0.253
3D body: height 1.02, standoff 0, extent -1.27,-1.27 1.26,1.265
3D body: height 5.59, standoff 0.51, extent 1.748,-0.253 2.254,0.253
3D body: height 1.02, standoff 0, extent 0.73,-1.27 3.26,1.265

## SIP2/2.54 [mm] "单排2.54插针, 焊盘: 外径1.5mm,孔径1mm"
height 10
pads (2):
  rect 1.5x1.5 hole 1: 1(-1.27,0)
  round 1.5 hole 1: 2(1.27,0)
Top Overlay:
  lines w0.254: 0,-1.27 0,1.27 ; -2.54,-1.27 2.794,-1.27 2.794,1.27 -2.54,1.27 -2.54,-1.27
3D body: height 1.02, standoff 0, extent 0,-1.27 2.53,1.265
3D body: height 5.59, standoff 0.51, extent 1.018,-0.253 1.524,0.253
3D body: height 1.02, standoff 0, extent -2.54,-1.27 -0.01,1.265
3D body: height 5.59, standoff 0.51, extent -1.522,-0.253 -1.016,0.253

## SIP2/2.54/LOCK [mm] "带锁单排2.54插针, 焊盘: 外径1.5mm,孔径1mm"
height 10
pads (2):
  rect 1.5x1.5 hole 1: 1(0,0)
  round 1.5 hole 1: 2(2.54,0)
Top Overlay:
  lines w0.254: -2.5,-2.3 -0.1,-2.3 -0.1,-1.4 2.6,-1.4 2.6,-2.3 5.1,-2.3 5.1,2.8 -2.5,2.8 -2.5,-2.3
3D body: height 1.02, standoff 0, extent 1.27,-1.27 3.8,1.265
3D body: height 5.59, standoff 0.51, extent 2.288,-0.253 2.794,0.253
3D body: height 1.02, standoff 0, extent -1.27,-1.27 1.26,1.265
3D body: height 5.59, standoff 0.51, extent -0.252,-0.253 0.254,0.253
3D body: height 5.08, standoff 0.25, extent -2.54,-2.54 0,-2.286
3D body: height 5.08, standoff 0.25, extent 2.54,-2.54 5.08,-2.286
3D body: height 5.08, standoff 0.25, extent -2.54,-2.54 -2.286,2.794
3D body: height 5.08, standoff 0.25, extent 4.826,-2.54 5.08,2.794
3D body: height 5.08, standoff 0.25, extent -2.54,2.54 5.08,2.794

## SIP2/5.2 [mm] "5.2mm间距2针RS485座"
height 10
pads (2):
  rect 1.8x1.8 hole 1: 1(0,0)
  round 1.8 hole 1: 2(5.2,0)
Top Overlay:
  lines w0.254: -2.2,-1.3 -2.2,9.7 7.8,9.7 7.8,-1.3 -2.2,-1.3